# Altium schematic symbol library LATTICEPLDS_Library.SchLib: 291 symbols (part 24 of 32) (continued)
## LFSC15-F900_bak (continued)
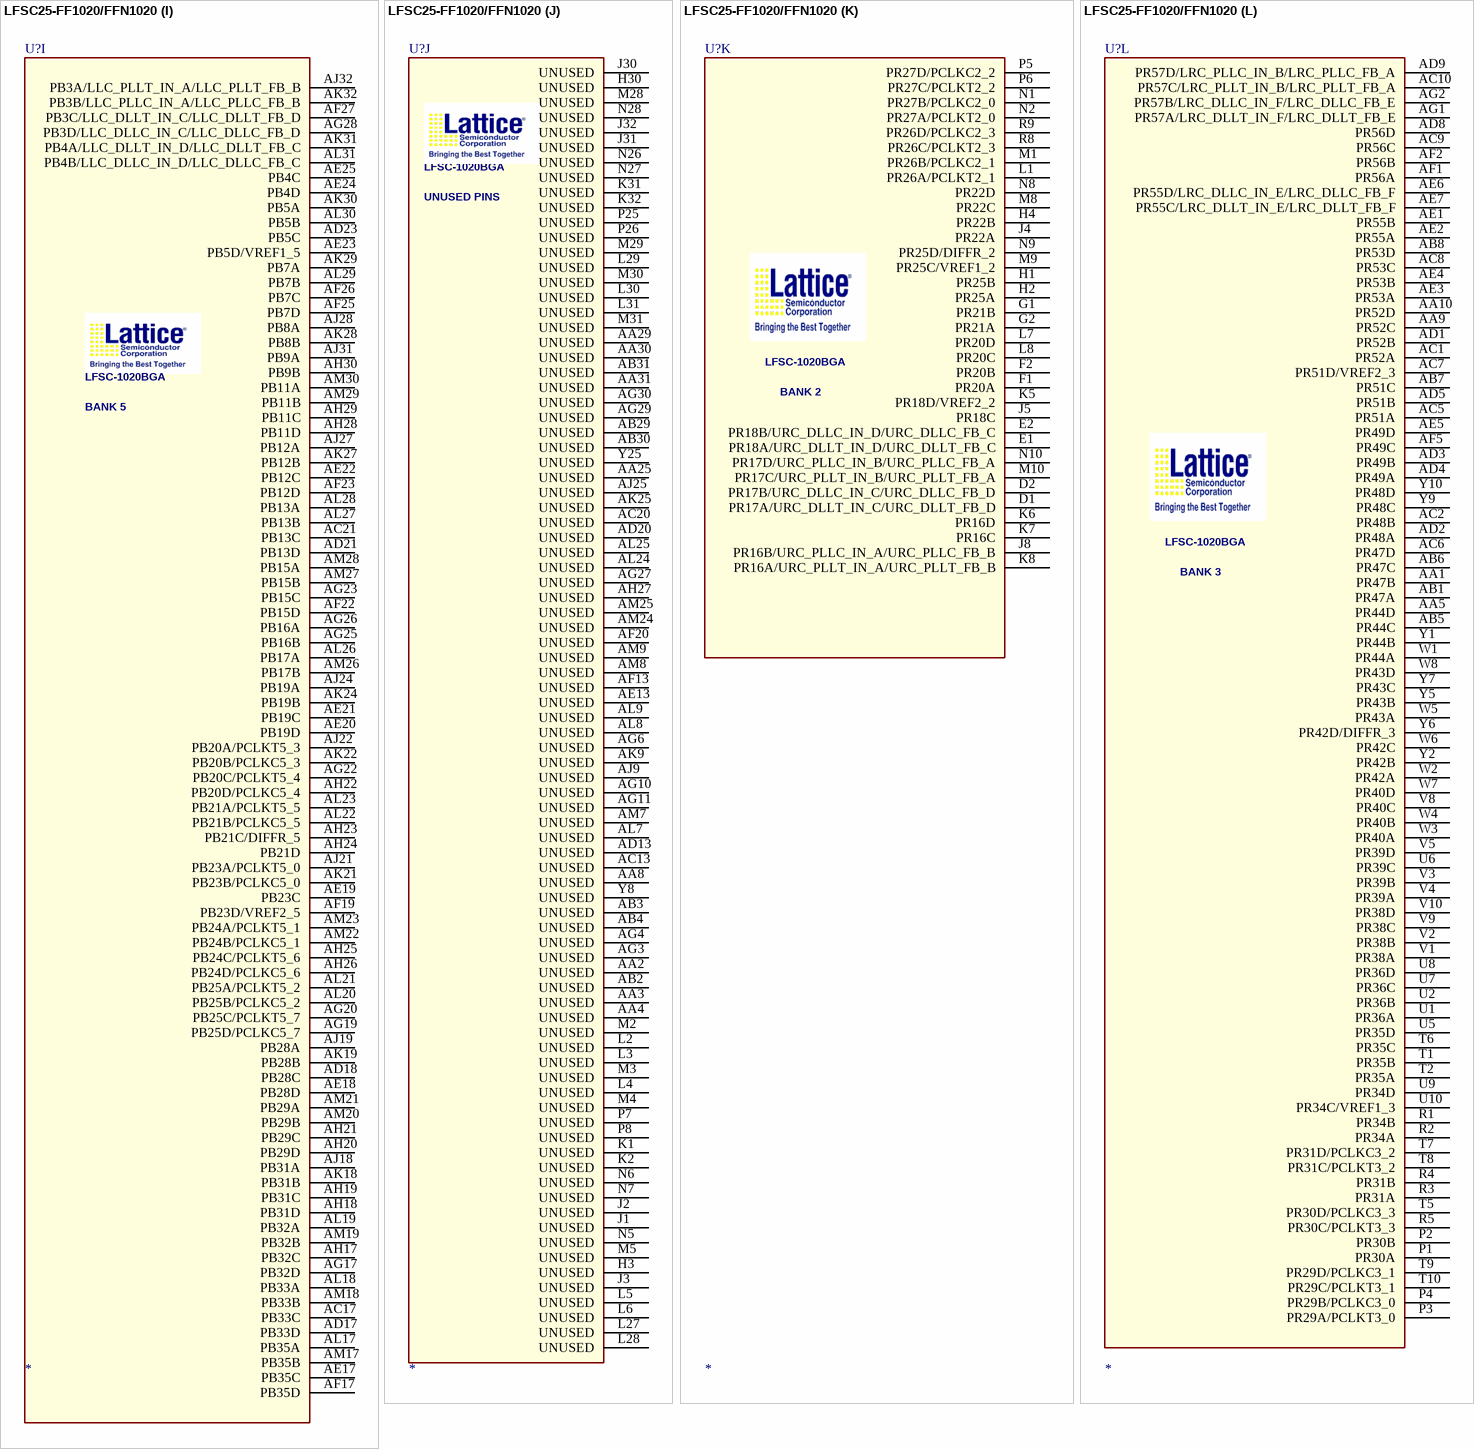
[diagram p235: symbol LFSC25-FF1020/FFN1020]
part A text: SERDES; SC-900FPBGA
part B text: SERDES / SUPPLIES; SC-900FPBGA
part C text: VCCIO; SC-900FPBGA
part D text: SC-900FPBGA
part E text: SC-900FPBGA
part F text: VSS; SC-900FPBGA
part G text: SC-900FPBGA
part H text: SC-900FPBGA
part I text: SC-900FPBGA
part J text: SC-900FPBGA; Memory / Controller
part K text: MPI / DATA/ADDR; SC-900FPBGA
part L text: VCCAUX; SC-900FPBGA
part M text: General Purpose / IO Pins; SC-900FPBGA
part N text: SC-900FPBGA; SPI4
part O text: SFI4/XSBI / RX; SC-900FPBGA
part P text: SFI4/XSBI / TX; SC-900FPBGA

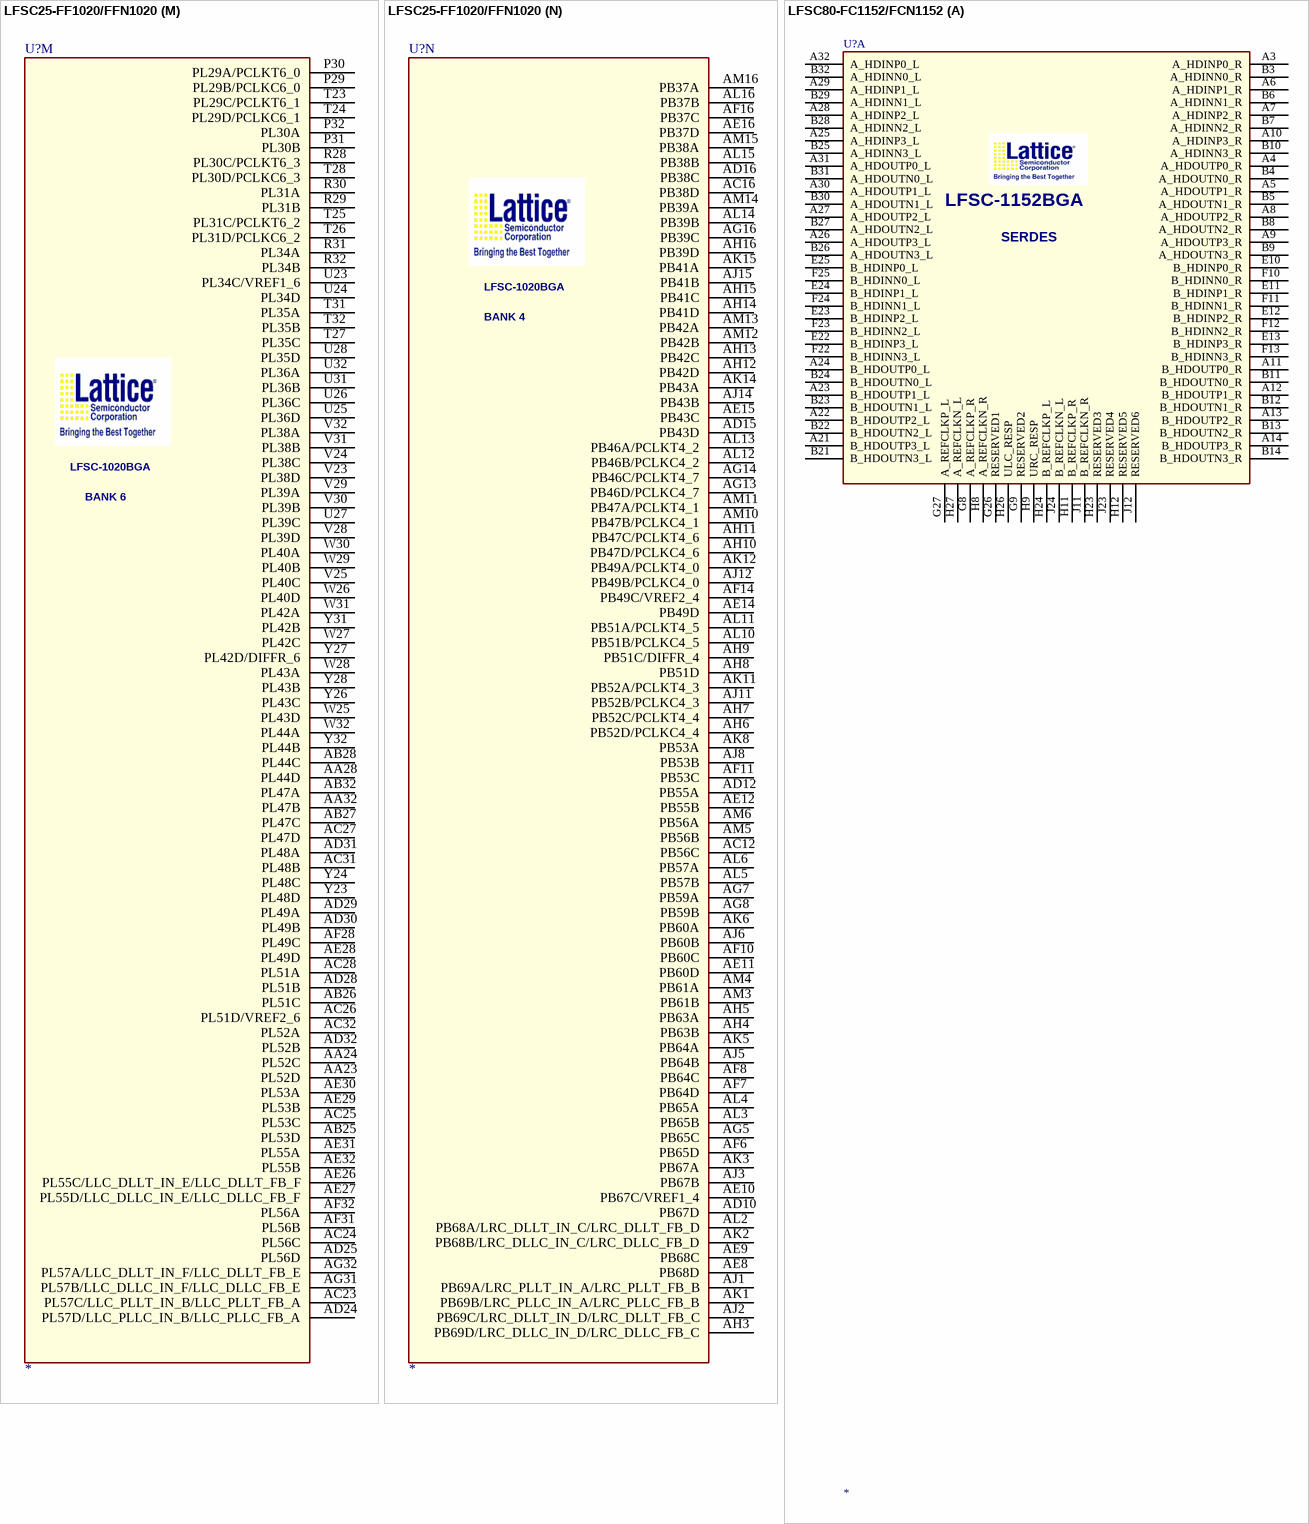
[diagram p236: symbols LFSC25-FF1020/FFN1020 to LFSC80-FC1152/FCN1152]

## LFSC25-FF1020/FFN1020
designator U?
SWAP_INFO: (S1+S2+S3+S4+S5+S6+S7+S8+S9+S10+S11); SPLIT_INST: TRUE
part A pins: AA11 VCCAUX (power), AA12 VCCAUX (power), AA14 VCC12 (power), AA16 VCC12 (power), AA17 VCC12 (power), AA19 VCC12 (power), AA21 VCCAUX (power), AA22 VCCAUX (power), AB11 VCCAUX (power), AB12 VCCAUX (power), AB13 VTT_4 (power), AB14 VTT_4 (power), AB15 VCCAUX (power), AB16 VCCAUX (power), AB17 VCCAUX (power), AB18 VCCAUX (power), AB19 VTT_5 (power), AB20 VTT_5 (power), AB21 VCCAUX (power), AB22 VCCAUX (power), AC15 VTT_4 (power), AC18 VTT_5 (power), AH1 PROBE_VCC, AH2 PROBE_GND, AH31 TEMP, AH32 XRES, J10 VCCJ (power), L11 VCCAUX (power), L12 VCCAUX (power), L14 VCCAUX (power), L15 VCCAUX (power), L18 VCCAUX (power), L19 VCCAUX (power), L21 VCCAUX (power), L22 VCCAUX (power), M11 VCCAUX (power), M12 VCCAUX (power), M14 VCC12 (power), M16 VCC12 (power), M17 VCC12 (power), M19 VCC12 (power), M21 VCCAUX (power), M22 VCCAUX (power), N11 VTT_2 (power), N22 VTT_7 (power), P11 VCCAUX (power), P12 VCC12 (power), P21 VCC12 (power), P22 VCCAUX (power), R10 VTT_2 (power), R11 VCCAUX (power), R22 VCCAUX (power), R23 VTT_7 (power), T11 VTT_3 (power), T12 VCC12 (power), T21 VCC12 (power), T22 VTT_6 (power), U11 VTT_3 (power), U12 VCC12 (power), U21 VCC12 (power), U22 VTT_6 (power), V11 VCCAUX (power), V22 VCCAUX (power), W11 VCCAUX (power), W12 VCC12 (power), W21 VCC12 (power), W22 VCCAUX (power), Y11 VTT_3 (power), Y22 VTT_6 (power)
part B pins: AA7 VCCIO3 (power), AA27 VCCIO6 (power), AB9 VCCIO3 (power), AB23 VCCIO6 (power), AC4 VCCIO3 (power), AC11 VCCIO4 (power), AC19 VCCIO5 (power), AC30 VCCIO6 (power), AD6 VCCIO3 (power), AD14 VCCIO4 (power), AD22 VCCIO5 (power), AD26 VCCIO6 (power), AF3 VCCIO3 (power), AF9 VCCIO4 (power), AF15 VCCIO4 (power), AF21 VCCIO5 (power), AF29 VCCIO6 (power), AG12 VCCIO4 (power), AG18 VCCIO5 (power), AG24 VCCIO5 (power), AJ7 VCCIO4 (power), AJ13 VCCIO4 (power), AJ17 VCCIO5 (power), AJ23 VCCIO5 (power), AJ30 VCCIO5 (power), AK4 VCCIO4 (power), AK10 VCCIO4 (power), AK16 VCCIO4 (power), AK20 VCCIO5 (power), AK26 VCCIO5 (power), C17 VCCIO1 (power), D16 VCCIO1 (power), F15 VCCIO1 (power), F24 VCCIO1 (power), G4 VCCIO2 (power), G9 VCCIO1 (power), G18 VCCIO1 (power), G30 VCCIO7 (power), J7 VCCIO2 (power), J11 VCCIO1 (power), J19 VCCIO1 (power), J27 VCCIO7 (power), K3 VCCIO2 (power), K14 VCCIO1 (power), K22 VCCIO1 (power), K29 VCCIO7 (power), L10 VCCIO2 (power), L24 VCCIO7 (power), M6 VCCIO2 (power), M26 VCCIO7 (power), N4 VCCIO2 (power), N30 VCCIO7 (power), P9 VCCIO2 (power), P23 VCCIO7 (power), R7 VCCIO2 (power), R27 VCCIO7 (power), T3 VCCIO3 (power), T29 VCCIO6 (power), U4 VCCIO3 (power), U30 VCCIO6 (power), V6 VCCIO3 (power), V26 VCCIO6 (power), W10 VCCIO3 (power), W24 VCCIO6 (power), Y3 VCCIO3 (power), Y29 VCCIO6 (power)
part C pins: N13 VCC (power), N15 VCC (power), N16 VCC (power), N17 VCC (power), N18 VCC (power), N20 VCC (power), P14 VCC (power), P16 VCC (power), P17 VCC (power), P19 VCC (power), R13 VCC (power), R15 VCC (power), R18 VCC (power), R20 VCC (power), T13 VCC (power), T14 VCC (power), T16 VCC (power), T17 VCC (power), T19 VCC (power), T20 VCC (power), U13 VCC (power), U14 VCC (power), U16 VCC (power), U17 VCC (power), U19 VCC (power), U20 VCC (power), V13 VCC (power), V15 VCC (power), V18 VCC (power), V20 VCC (power), W14 VCC (power), W16 VCC (power), W17 VCC (power), W19 VCC (power), Y13 VCC (power), Y15 VCC (power), Y16 VCC (power), Y17 VCC (power), Y18 VCC (power), Y20 VCC (power)
part D pins: A2 GND (power), A10 GND (power), A23 GND (power), A31 GND (power), AA6 GND (power), AA13 GND (power), AA15 GND (power), AA18 GND (power), AA20 GND (power), AA26 GND (power), AB10 GND (power), AB24 GND (power), AC3 GND (power), AC14 GND (power), AC22 GND (power), AC29 GND (power), AD7 GND (power), AD11 GND (power), AD19 GND (power), AD27 GND (power), AF4 GND (power), AF12 GND (power), AF18 GND (power), AF24 GND (power), AF30 GND (power), AG9 GND (power), AG15 GND (power), AG21 GND (power), AJ4 GND (power), AJ10 GND (power), AJ16 GND (power), AJ20 GND (power), AJ26 GND (power), AJ29 GND (power), AK7 GND (power), AK13 GND (power), AK17 GND (power), AK23 GND (power), AL1 GND (power), AL32 GND (power), AM2 GND (power), AM31 GND (power), B1 GND (power), B32 GND (power), C3 GND (power), C4 GND (power), C6 GND (power), C7 GND (power), C8 GND (power), C9 GND (power), C11 GND (power), C12 GND (power), C16 GND (power), C21 GND (power), C22 GND (power), C24 GND (power), C25 GND (power), C26 GND (power), C27 GND (power), C29 GND (power), C30 GND (power), D17 GND (power), F3 GND (power), F9 GND (power), F18 GND (power), F30 GND (power), G3 GND (power), G15 GND (power), G24 GND (power), G29 GND (power), J6 GND (power), J14 GND (power), J22 GND (power), J26 GND (power), K4 GND (power), K11 GND (power), K19 GND (power), K30 GND (power), L9 GND (power), L23 GND (power), M7 GND (power), M13 GND (power), M15 GND (power), M18 GND (power), M20 GND (power), M27 GND (power), N3 GND (power), N12 GND (power), N14 GND (power), N19 GND (power), N21 GND (power), N29 GND (power), P10 GND (power), P13 GND (power), P15 GND (power), P18 GND (power), P20 GND (power), P24 GND (power), R6 GND (power), R12 GND (power), R14 GND (power), R16 GND (power), R17 GND (power), R19 GND (power), R21 GND (power), R26 GND (power), T4 GND (power), T15 GND (power), T18 GND (power), T30 GND (power), U3 GND (power), U15 GND (power), U18 GND (power), U29 GND (power), V7 GND (power), V12 GND (power), V14 GND (power), V16 GND (power), V17 GND (power), V19 GND (power), V21 GND (power), V27 GND (power), W9 GND (power), W13 GND (power), W15 GND (power), W18 GND (power), W20 GND (power), W23 GND (power), Y4 GND (power), Y12 GND (power), Y14 GND (power), Y19 GND (power), Y21 GND (power), Y30 GND (power)
part E pins: A5 VDDAX25_R, A28 VDDAX25_L, B2 A_VDDIB0_R, B5 A_VDDP_R, B10 B_VDDP_R, B23 B_VDDP_L, B28 A_VDDP_L, B31 A_VDDIB0_L, D3 A_VDDOB0_R, D4 A_VDDOB1_R, D6 A_VDDOB2_R, D7 A_VDDOB3_R, D8 B_VDDOB0_R, D9 B_VDDOB1_R, D11 B_VDDOB2_R, D12 B_VDDOB3_R, D21 B_VDDOB3_L, D22 B_VDDOB2_L, D24 B_VDDOB1_L, D25 B_VDDOB0_L, D26 A_VDDOB3_L, D27 A_VDDOB2_L, D29 A_VDDOB1_L, D30 A_VDDOB0_L, E3 A_VDDRX01_R, E4 A_VDDTX01_R, E6 A_VDDRX23_R, E7 A_VDDTX23_R, E8 B_VDDRX01_R, E9 B_VDDTX01_R, E11 B_VDDRX23_R, E12 B_VDDTX23_R, E21 B_VDDTX23_L, E22 B_VDDRX23_L, E24 B_VDDTX01_L, E25 B_VDDRX01_L, E26 A_VDDTX23_L, E27 A_VDDRX23_L, E29 A_VDDTX01_L, E30 A_VDDRX01_L, F4 A_VDDIB1_R, F29 A_VDDIB1_L, H6 A_VDDIB2_R, H7 A_VDDIB3_R, H8 B_VDDIB0_R, H9 B_VDDIB1_R, H11 B_VDDIB2_R, H12 B_VDDIB3_R, H21 B_VDDIB3_L, H22 B_VDDIB2_L, H24 B_VDDIB1_L, H25 B_VDDIB0_L, H26 A_VDDIB3_L, H27 A_VDDIB2_L
part F pins: A3 A_HDOUTP0_R, A4 A_HDOUTP1_R, A6 A_HDOUTP2_R, A7 A_HDOUTP3_R, A8 B_HDOUTP0_R, A9 B_HDOUTP1_R, A11 B_HDOUTP2_R, A12 B_HDOUTP3_R, A21 B_HDOUTP3_L, A22 B_HDOUTP2_L, A24 B_HDOUTP1_L, A25 B_HDOUTP0_L, A26 A_HDOUTP3_L, A27 A_HDOUTP2_L, A29 A_HDOUTP1_L, A30 A_HDOUTP0_L, B3 A_HDOUTN0_R, B4 A_HDOUTN1_R, B6 A_HDOUTN2_R, B7 A_HDOUTN3_R, B8 B_HDOUTN0_R, B9 B_HDOUTN1_R, B11 B_HDOUTN2_R, B12 B_HDOUTN3_R, B21 B_HDOUTN3_L, B22 B_HDOUTN2_L, B24 B_HDOUTN1_L, B25 B_HDOUTN0_L, B26 A_HDOUTN3_L, B27 A_HDOUTN2_L, B29 A_HDOUTN1_L, B30 A_HDOUTN0_L, C1 A_HDINP0_R, C2 A_HDINN0_R, C5 A_REFCLKP_R, C10 B_REFCLKP_R, C23 B_REFCLKP_L, C28 A_REFCLKP_L, C31 A_HDINN0_L, C32 A_HDINP0_L, D5 A_REFCLKN_R, D10 B_REFCLKN_R, D23 B_REFCLKN_L, D28 A_REFCLKN_L, E5 A_RXREFCLKP_R, E10 B_RXREFCLKP_R, E23 B_RXREFCLKP_L, E28 A_RXREFCLKP_L, F5 A_RXREFCLKN_R, F6 A_HDINP2_R, F7 A_HDINP3_R, F8 B_HDINP0_R, F10 B_RXREFCLKN_R, F11 B_HDINP2_R, F12 B_HDINP3_R, F21 B_HDINP3_L, F22 B_HDINP2_L, F23 B_RXREFCLKN_L, F25 B_HDINP0_L, F26 A_HDINP3_L, F27 A_HDINP2_L, F28 A_RXREFCLKN_L, G5 A_HDINP1_R, G6 A_HDINN2_R, G7 A_HDINN3_R, G8 B_HDINN0_R, G10 B_HDINP1_R, G11 B_HDINN2_R, G12 B_HDINN3_R, G21 B_HDINN3_L, G22 B_HDINN2_L, G23 B_HDINP1_L, G25 B_HDINN0_L, G26 A_HDINN3_L, G27 A_HDINN2_L, G28 A_HDINP1_L, H5 A_HDINN1_R, H10 B_HDINN1_R, H23 B_HDINN1_L, H28 A_HDINN1_L
part G pins: A13 PT39A/EXTCLKP2I, A14 PT39B/EXTCLKP2O, A15 PT37A/MPICLK/PCLKT1_0, A16 PT37B/PCLKC1_0, A17 PT35B/MPIRTRYN, A18 PT35A/A0, A19 PT32B/A5, A20 PT32A/A6, B13 PT43A/QOUT, B14 PT43B/D0, B15 PT38A/MPIACKN, B16 PT38B/DP0, B17 PT33B/A3, B18 PT33A/A4, B19 PT28B/A11, B20 PT28A/A12, C13 PT45B/D2, C14 PT45A/D1, C15 PT42B/DOUT, C18 PT29B/A9, C19 PT27A/A14, C20 PT27B/A13, D13 PT46B/D6, D14 PT46A/D5, D15 PT42A/EXTDONEI, D18 PT29A/A10, D19 PT25A/A17, D20 PT25B/A15, E13 PT49B/D8, E14 PT47B/CS0N, E15 PT45D/D4, E16 PT45C/D3, E17 PT27D/D11, E18 PT27C/D12, E19 PT24B/A18, E20 PT23B/A21, F13 PT49A/CS1, F14 PT47A/RDN, F16 PT38C/RDY, F17 PT33D/A1, F19 PT24A/MPITEAN, F20 PT23A/D15, G13 PT47C/D10, G14 PT46C/D7, G16 PT38D/EXTDONEO, G17 PT33C/A2, G19 PT25C/D13, G20 PT24C/A20, H13 PT47D/D9, H14 PT46D/WRN, H15 PT39D/D21/PCLKC1_1, H16 PT39C/D22/PCLKT1_1, H17 PT32D/D25/PCLKC1_5, H18 PT32C/D26/PCLKT1_5, H19 PT25D/A16, H20 PT24D/A19, J9 TDO, J12 TCK, J13 TDI, J15 PT49D/HDC, J16 PT41B/EXTCLKP1O, J17 PT31B/A7, J18 PT23D/D14, J20 RDCFGN, J21 RESETN, J23 M1, J24 M2, K9 TMS, K10 CCLK, K12 PROGRAMN, K13 MPIIRQN, K15 PT49C/LDCN, K16 PT41A/EXTCLKP1I, K17 PT31A/A8, K18 PT23C/DP1, K20 DONE, K21 INITN, K23 M0, K24 M3, L13 PT42D/VREF2_1, L16 PT37C/DP2, L17 PT35C/D24/PCLKT1_4, L20 PT31C/VREF1_1
part H pins: D31 PL17B/ULC_DLLC_IN_C/ULC_DLLC_FB_D/DEBUG_BUS8, D32 PL17A/ULC_DLLT_IN_C/ULC_DLLT_FB_D/DEBUG_BUS9, E31 PL18B/ULC_DLLC_IN_D/ULC_DLLC_FB_C, E32 PL18A/ULC_DLLT_IN_D/ULC_DLLT_FB_C, F31 PL20B, F32 PL20A, G31 PL21A, G32 PL21B, H29 PL22B, H31 PL25A/TESTCFGN, H32 PL25B/DEBUG_BUS7, J25 PL16B/ULC_PLLC_IN_A/ULC_PLLC_FB_B/DEBUG_BUS10, J28 PL18C/DEBUG_BUS12, J29 PL22A, K25 PL16A/ULC_PLLT_IN_A/ULC_PLLT_FB_B/DEBUG_BUS11, K26 PL16C/DEBUG_BUS13, K27 PL16D, K28 PL18D/VREF2_7/DEBUG_BUS6, L25 PL20C, L26 PL20D, L32 PL26A/PCLKT7_1/DEBUG_BUS3, M23 PL17C/ULC_PLLT_IN_B/ULC_PLLT_FB_A, M24 PL25C/VREF1_7/DEBUG_BUS5, M25 PL22C, M32 PL26B/PCLKC7_1/DEBUG_BUS2, N23 PL17D/ULC_PLLC_IN_B/ULC_PLLC_FB_A, N24 PL25D/DIFFR_7/DEBUG_BUS4, N25 PL22D, N31 PL27A/PCLKT7_0/DEBUG_BUS1, N32 PL27B/PCLKC7_0/DEBUG_BUS0, P27 PL27C/PCLKT7_2/DEBUG_BUS14, P28 PL27D/PCLKC7_2/DEBUG_BUS15, R24 PL26D/PCLKC7_3, R25 PL26C/PCLKT7_3
part I pins: AC17 PB33C, AC21 PB13C, AD17 PB33D, AD18 PB28C, AD21 PB13D, AD23 PB5C, AE17 PB35C, AE18 PB28D, AE19 PB23C, AE20 PB19D, AE21 PB19C, AE22 PB12C, AE23 PB5D/VREF1_5, AE24 PB4D, AE25 PB4C, AF17 PB35D, AF19 PB23D/VREF2_5, AF22 PB15D, AF23 PB12D, AF25 PB7D, AF26 PB7C, AF27 PB3C/LLC_DLLT_IN_C/LLC_DLLT_FB_D, AG17 PB32D, AG19 PB25D/PCLKC5_7, AG20 PB25C/PCLKT5_7, AG22 PB20C/PCLKT5_4, AG23 PB15C, AG25 PB16B, AG26 PB16A, AG28 PB3D/LLC_DLLC_IN_C/LLC_DLLC_FB_D, AH17 PB32C, AH18 PB31D, AH19 PB31C, AH20 PB29D, AH21 PB29C, AH22 PB20D/PCLKC5_4, AH23 PB21C/DIFFR_5, AH24 PB21D, AH25 PB24C/PCLKT5_6, AH26 PB24D/PCLKC5_6, AH28 PB11D, AH29 PB11C, AH30 PB9B, AJ18 PB31A, AJ19 PB28A, AJ21 PB23A/PCLKT5_0, AJ22 PB20A/PCLKT5_3, AJ24 PB19A, AJ27 PB12A, AJ28 PB8A, AJ31 PB9A, AJ32 PB3A/LLC_PLLT_IN_A/LLC_PLLT_FB_B, AK18 PB31B, AK19 PB28B, AK21 PB23B/PCLKC5_0, AK22 PB20B/PCLKC5_3, AK24 PB19B, AK27 PB12B, AK28 PB8B, AK29 PB7A, AK30 PB5A, AK31 PB4A/LLC_DLLT_IN_D/LLC_DLLT_FB_C, AK32 PB3B/LLC_PLLC_IN_A/LLC_PLLC_FB_B, AL17 PB35A, AL18 PB33A, AL19 PB32A, AL20 PB25B/PCLKC5_2, AL21 PB25A/PCLKT5_2, AL22 PB21B/PCLKC5_5, AL23 PB21A/PCLKT5_5, AL26 PB17A, AL27 PB13B, AL28 PB13A, AL29 PB7B, AL30 PB5B, AL31 PB4B/LLC_DLLC_IN_D/LLC_DLLC_FB_C, AM17 PB35B, AM18 PB33B, AM19 PB32B, AM20 PB29B, AM21 PB29A, AM22 PB24B/PCLKC5_1, AM23 PB24A/PCLKT5_1, AM26 PB17B, AM27 PB15B, AM28 PB15A, AM29 PB11B, AM30 PB11A
part J pins: AA2 UNUSED, AA3 UNUSED, AA4 UNUSED, AA8 UNUSED, AA25 UNUSED, AA29 UNUSED, AA30 UNUSED, AA31 UNUSED, AB2 UNUSED, AB3 UNUSED, AB4 UNUSED, AB29 UNUSED, AB30 UNUSED, AB31 UNUSED, AC13 UNUSED, AC20 UNUSED, AD13 UNUSED, AD20 UNUSED, AE13 UNUSED, AF13 UNUSED, AF20 UNUSED, AG3 UNUSED, AG4 UNUSED, AG6 UNUSED, AG10 UNUSED, AG11 UNUSED, AG27 UNUSED, AG29 UNUSED, AG30 UNUSED, AH27 UNUSED, AJ9 UNUSED, AJ25 UNUSED, AK9 UNUSED, AK25 UNUSED, AL7 UNUSED, AL8 UNUSED, AL9 UNUSED, AL24 UNUSED, AL25 UNUSED, AM7 UNUSED, AM8 UNUSED, AM9 UNUSED, AM24 UNUSED, AM25 UNUSED, H3 UNUSED, H30 UNUSED, J1 UNUSED, J2 UNUSED, J3 UNUSED, J30 UNUSED, J31 UNUSED, J32 UNUSED, K1 UNUSED, K2 UNUSED, K31 UNUSED, K32 UNUSED, L2 UNUSED, L3 UNUSED, L4 UNUSED, L5 UNUSED, L6 UNUSED, L27 UNUSED, L28 UNUSED, L29 UNUSED, L30 UNUSED, L31 UNUSED, M2 UNUSED, M3 UNUSED, M4 UNUSED, M5 UNUSED, M28 UNUSED, M29 UNUSED, M30 UNUSED, M31 UNUSED, N5 UNUSED, N6 UNUSED, N7 UNUSED, N26 UNUSED, N27 UNUSED, N28 UNUSED, P7 UNUSED, P8 UNUSED, P25 UNUSED, P26 UNUSED, Y8 UNUSED, Y25 UNUSED
part K pins: D1 PR17A/URC_DLLT_IN_C/URC_DLLT_FB_D, D2 PR17B/URC_DLLC_IN_C/URC_DLLC_FB_D, E1 PR18A/URC_DLLT_IN_D/URC_DLLT_FB_C, E2 PR18B/URC_DLLC_IN_D/URC_DLLC_FB_C, F1 PR20A, F2 PR20B, G1 PR21B, G2 PR21A, H1 PR25B, H2 PR25A, H4 PR22B, J4 PR22A, J5 PR18C, J8 PR16B/URC_PLLC_IN_A/URC_PLLC_FB_B, K5 PR18D/VREF2_2, K6 PR16D, K7 PR16C, K8 PR16A/URC_PLLT_IN_A/URC_PLLT_FB_B, L1 PR26A/PCLKT2_1, L7 PR20D, L8 PR20C, M1 PR26B/PCLKC2_1, M8 PR22C, M9 PR25C/VREF1_2, M10 PR17C/URC_PLLT_IN_B/URC_PLLT_FB_A, N1 PR27B/PCLKC2_0, N2 PR27A/PCLKT2_0, N8 PR22D, N9 PR25D/DIFFR_2, N10 PR17D/URC_PLLC_IN_B/URC_PLLC_FB_A, P5 PR27D/PCLKC2_2, P6 PR27C/PCLKT2_2, R8 PR26C/PCLKT2_3, R9 PR26D/PCLKC2_3
part L pins: AA1 PR47B, AA5 PR44D, AA9 PR52C, AA10 PR52D, AB1 PR47A, AB5 PR44C, AB6 PR47C, AB7 PR51C, AB8 PR53D, AC1 PR52A, AC2 PR48B, AC5 PR51A, AC6 PR47D, AC7 PR51D/VREF2_3, AC8 PR53C, AC9 PR56C, AC10 PR57C/LRC_PLLT_IN_B/LRC_PLLT_FB_A, AD1 PR52B, AD2 PR48A, AD3 PR49B, AD4 PR49A, AD5 PR51B, AD8 PR56D, AD9 PR57D/LRC_PLLC_IN_B/LRC_PLLC_FB_A, AE1 PR55B, AE2 PR55A, AE3 PR53A, AE4 PR53B, AE5 PR49D, AE6 PR55D/LRC_DLLC_IN_E/LRC_DLLC_FB_F, AE7 PR55C/LRC_DLLT_IN_E/LRC_DLLT_FB_F, AF1 PR56A, AF2 PR56B, AF5 PR49C, AG1 PR57A/LRC_DLLT_IN_F/LRC_DLLT_FB_E, AG2 PR57B/LRC_DLLC_IN_F/LRC_DLLC_FB_E, P1 PR30A, P2 PR30B, P3 PR29A/PCLKT3_0, P4 PR29B/PCLKC3_0, R1 PR34B, R2 PR34A, R3 PR31A, R4 PR31B, R5 PR30C/PCLKT3_3, T1 PR35B, T2 PR35A, T5 PR30D/PCLKC3_3, T6 PR35C, T7 PR31D/PCLKC3_2, T8 PR31C/PCLKT3_2, T9 PR29D/PCLKC3_1, T10 PR29C/PCLKT3_1, U1 PR36A, U2 PR36B, U5 PR35D, U6 PR39C, U7 PR36C, U8 PR36D, U9 PR34D, U10 PR34C/VREF1_3, V1 PR38A, V2 PR38B, V3 PR39B, V4 PR39A, V5 PR39D, V8 PR40C, V9 PR38C, V10 PR38D, W1 PR44A, W2 PR42A, W3 PR40A, W4 PR40B, W5 PR43A, W6 PR42C, W7 PR40D, W8 PR43D, Y1 PR44B, Y2 PR42B, Y5 PR43B, Y6 PR42D/DIFFR_3, Y7 PR43C, Y9 PR48C, Y10 PR48D
part M pins: AA23 PL52D, AA24 PL52C, AA28 PL44D, AA32 PL47B, AB25 PL53D, AB26 PL51C, AB27 PL47C, AB28 PL44C, AB32 PL47A, AC23 PL57C/LLC_PLLT_IN_B/LLC_PLLT_FB_A, AC24 PL56C, AC25 PL53C, AC26 PL51D/VREF2_6, AC27 PL47D, AC28 PL51A, AC31 PL48B, AC32 PL52A, AD24 PL57D/LLC_PLLC_IN_B/LLC_PLLC_FB_A, AD25 PL56D, AD28 PL51B, AD29 PL49A, AD30 PL49B, AD31 PL48A, AD32 PL52B, AE26 PL55C/LLC_DLLT_IN_E/LLC_DLLT_FB_F, AE27 PL55D/LLC_DLLC_IN_E/LLC_DLLC_FB_F, AE28 PL49D, AE29 PL53B, AE30 PL53A, AE31 PL55A, AE32 PL55B, AF28 PL49C, AF31 PL56B, AF32 PL56A, AG31 PL57B/LLC_DLLC_IN_F/LLC_DLLC_FB_E, AG32 PL57A/LLC_DLLT_IN_F/LLC_DLLT_FB_E, P29 PL29B/PCLKC6_0, P30 PL29A/PCLKT6_0, P31 PL30B, P32 PL30A, R28 PL30C/PCLKT6_3, R29 PL31B, R30 PL31A, R31 PL34A, R32 PL34B, T23 PL29C/PCLKT6_1, T24 PL29D/PCLKC6_1, T25 PL31C/PCLKT6_2, T26 PL31D/PCLKC6_2, T27 PL35C, T28 PL30D/PCLKC6_3, T31 PL35A, T32 PL35B, U23 PL34C/VREF1_6, U24 PL34D, U25 PL36D, U26 PL36C, U27 PL39C, U28 PL35D, U31 PL36B, U32 PL36A, V23 PL38D, V24 PL38C, V25 PL40C, V28 PL39D, V29 PL39A, V30 PL39B, V31 PL38B, V32 PL38A, W25 PL43D, W26 PL40D, W27 PL42C, W28 PL43A, W29 PL40B, W30 PL40A, W31 PL42A, W32 PL44A, Y23 PL48D, Y24 PL48C, Y26 PL43C, Y27 PL42D/DIFFR_6, Y28 PL43B, Y31 PL42B, Y32 PL44B
part N pins: AC12 PB56C, AC16 PB38D, AD10 PB67D, AD12 PB55A, AD15 PB43D, AD16 PB38C, AE8 PB68D, AE9 PB68C, AE10 PB67C/VREF1_4, AE11 PB60D, AE12 PB55B, AE14 PB49D, AE15 PB43C, AE16 PB37D, AF6 PB65D, AF7 PB64D, AF8 PB64C, AF10 PB60C, AF11 PB53C, AF14 PB49C/VREF2_4, AF16 PB37C, AG5 PB65C, AG7 PB59A, AG8 PB59B, AG13 PB46D/PCLKC4_7, AG14 PB46C/PCLKT4_7, AG16 PB39C, AH3 PB69D/LRC_DLLC_IN_D/LRC_DLLC_FB_C, AH4 PB63B, AH5 PB63A, AH6 PB52D/PCLKC4_4, AH7 PB52C/PCLKT4_4, AH8 PB51D, AH9 PB51C/DIFFR_4, AH10 PB47D/PCLKC4_6, AH11 PB47C/PCLKT4_6, AH12 PB42D, AH13 PB42C, AH14 PB41D, AH15 PB41C, AH16 PB39D, AJ1 PB69A/LRC_PLLT_IN_A/LRC_PLLT_FB_B, AJ2 PB69C/LRC_DLLT_IN_D/LRC_DLLT_FB_C, AJ3 PB67B, AJ5 PB64B, AJ6 PB60B, AJ8 PB53B, AJ11 PB52B/PCLKC4_3, AJ12 PB49B/PCLKC4_0, AJ14 PB43B, AJ15 PB41B, AK1 PB69B/LRC_PLLC_IN_A/LRC_PLLC_FB_B, AK2 PB68B/LRC_DLLC_IN_C/LRC_DLLC_FB_D, AK3 PB67A, AK5 PB64A, AK6 PB60A, AK8 PB53A, AK11 PB52A/PCLKT4_3, AK12 PB49A/PCLKT4_0, AK14 PB43A, AK15 PB41A, AL2 PB68A/LRC_DLLT_IN_C/LRC_DLLT_FB_D, AL3 PB65B, AL4 PB65A, AL5 PB57B, AL6 PB57A, AL10 PB51B/PCLKC4_5, AL11 PB51A/PCLKT4_5, AL12 PB46B/PCLKC4_2, AL13 PB46A/PCLKT4_2, AL14 PB39B, AL15 PB38B, AL16 PB37B, AM3 PB61B, AM4 PB61A, AM5 PB56B, AM6 PB56A, AM10 PB47B/PCLKC4_1, AM11 PB47A/PCLKT4_1, AM12 PB42B, AM13 PB42A, AM14 PB39A, AM15 PB38A, AM16 PB37A
part A text: LFSC-1020BGA; SUPPLIES
part B text: LFSC-1020BGA; SUPPLIES
part C text: LFSC-1020BGA; SUPPLIES
part D text: LFSC-1020BGA; SUPPLIES
part E text: LFSC-1020BGA; ANALOG POWER
part F text: LFSC-1020BGA; SERDES
part G text: LFSC-1020BGA; CONFIG/TOP BANK
part H text: LFSC-1020BGA; BANK 7
part I text: LFSC-1020BGA; BANK 5
part J text: LFSC-1020BGA; UNUSED PINS
part K text: LFSC-1020BGA; BANK 2
part L text: LFSC-1020BGA; BANK 3
part M text: LFSC-1020BGA; BANK 6
part N text: LFSC-1020BGA; BANK 4

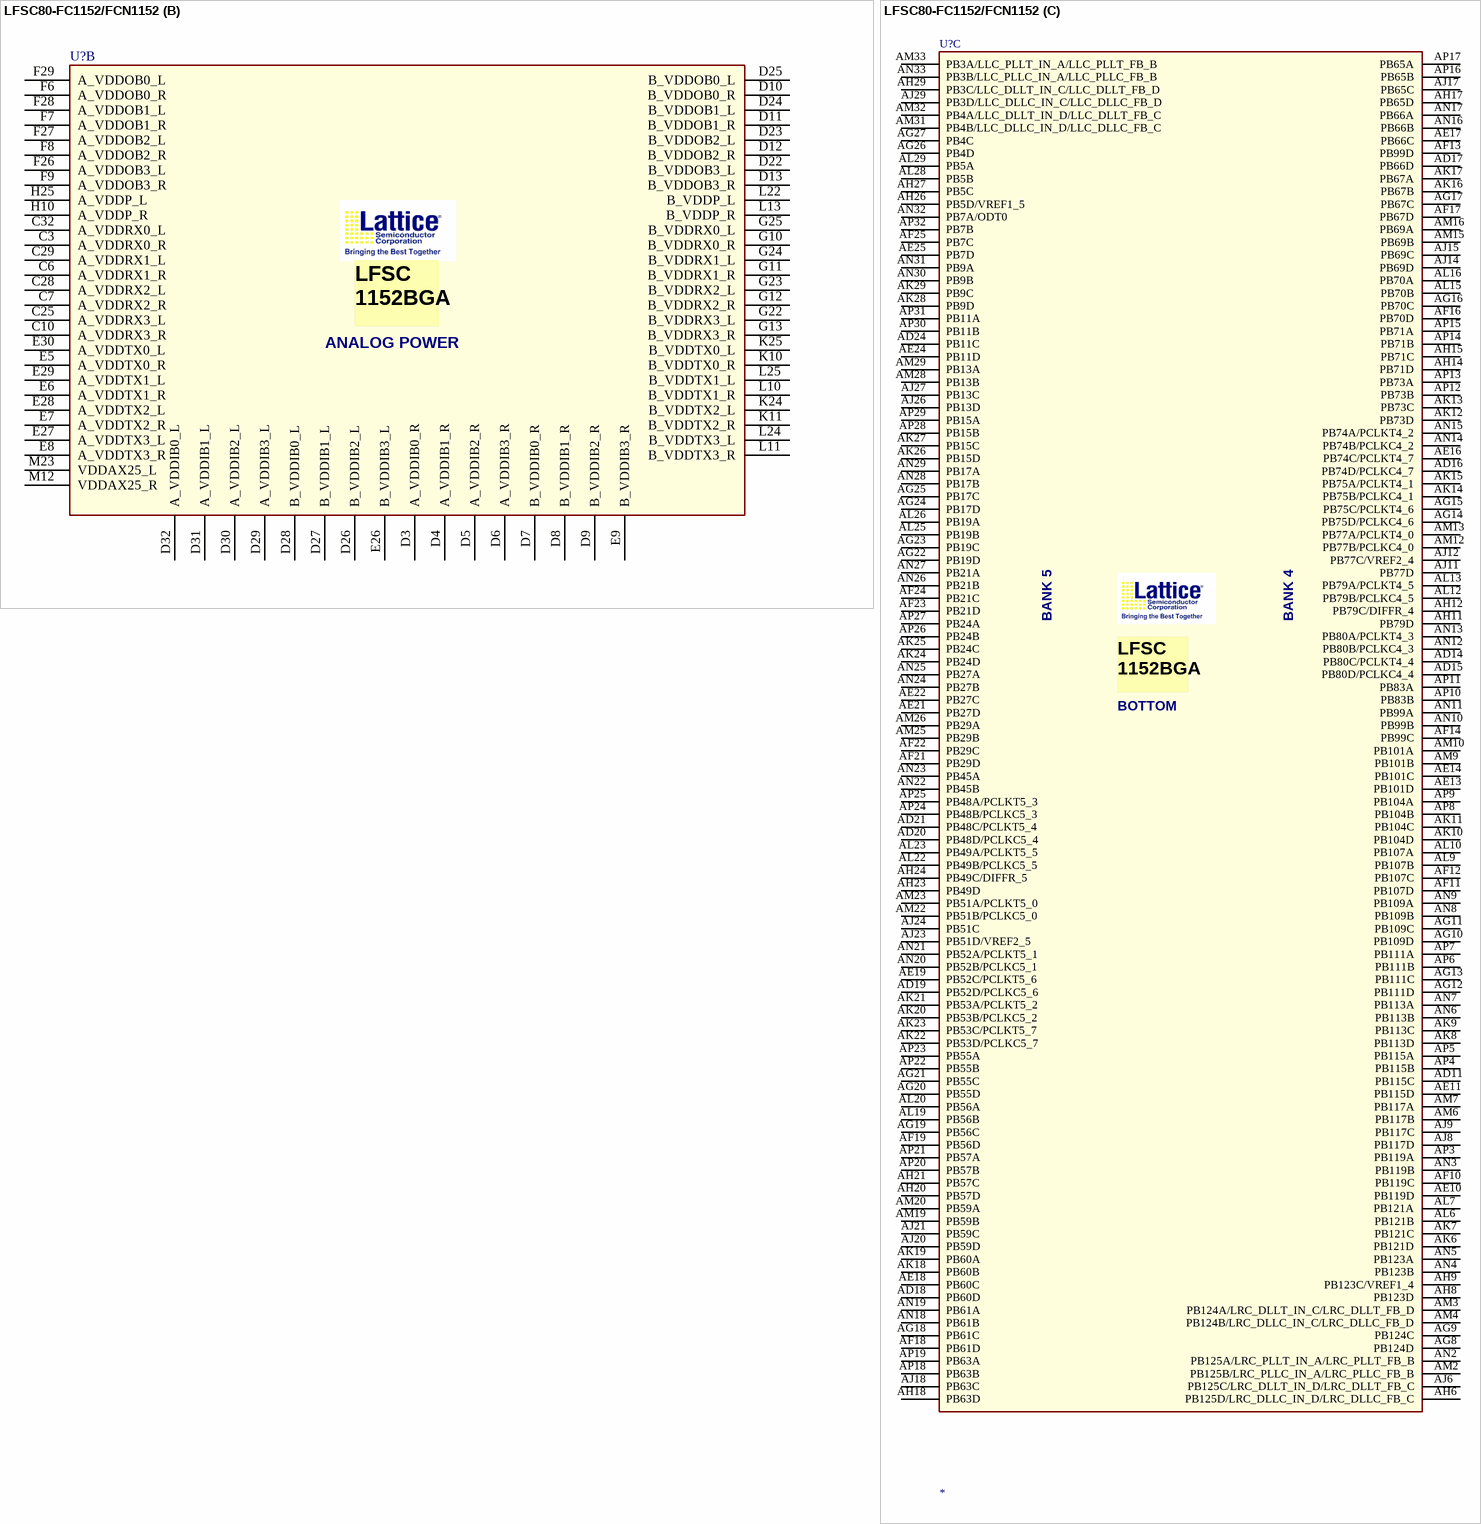
[diagram p237: symbol LFSC80-FC1152/FCN1152]

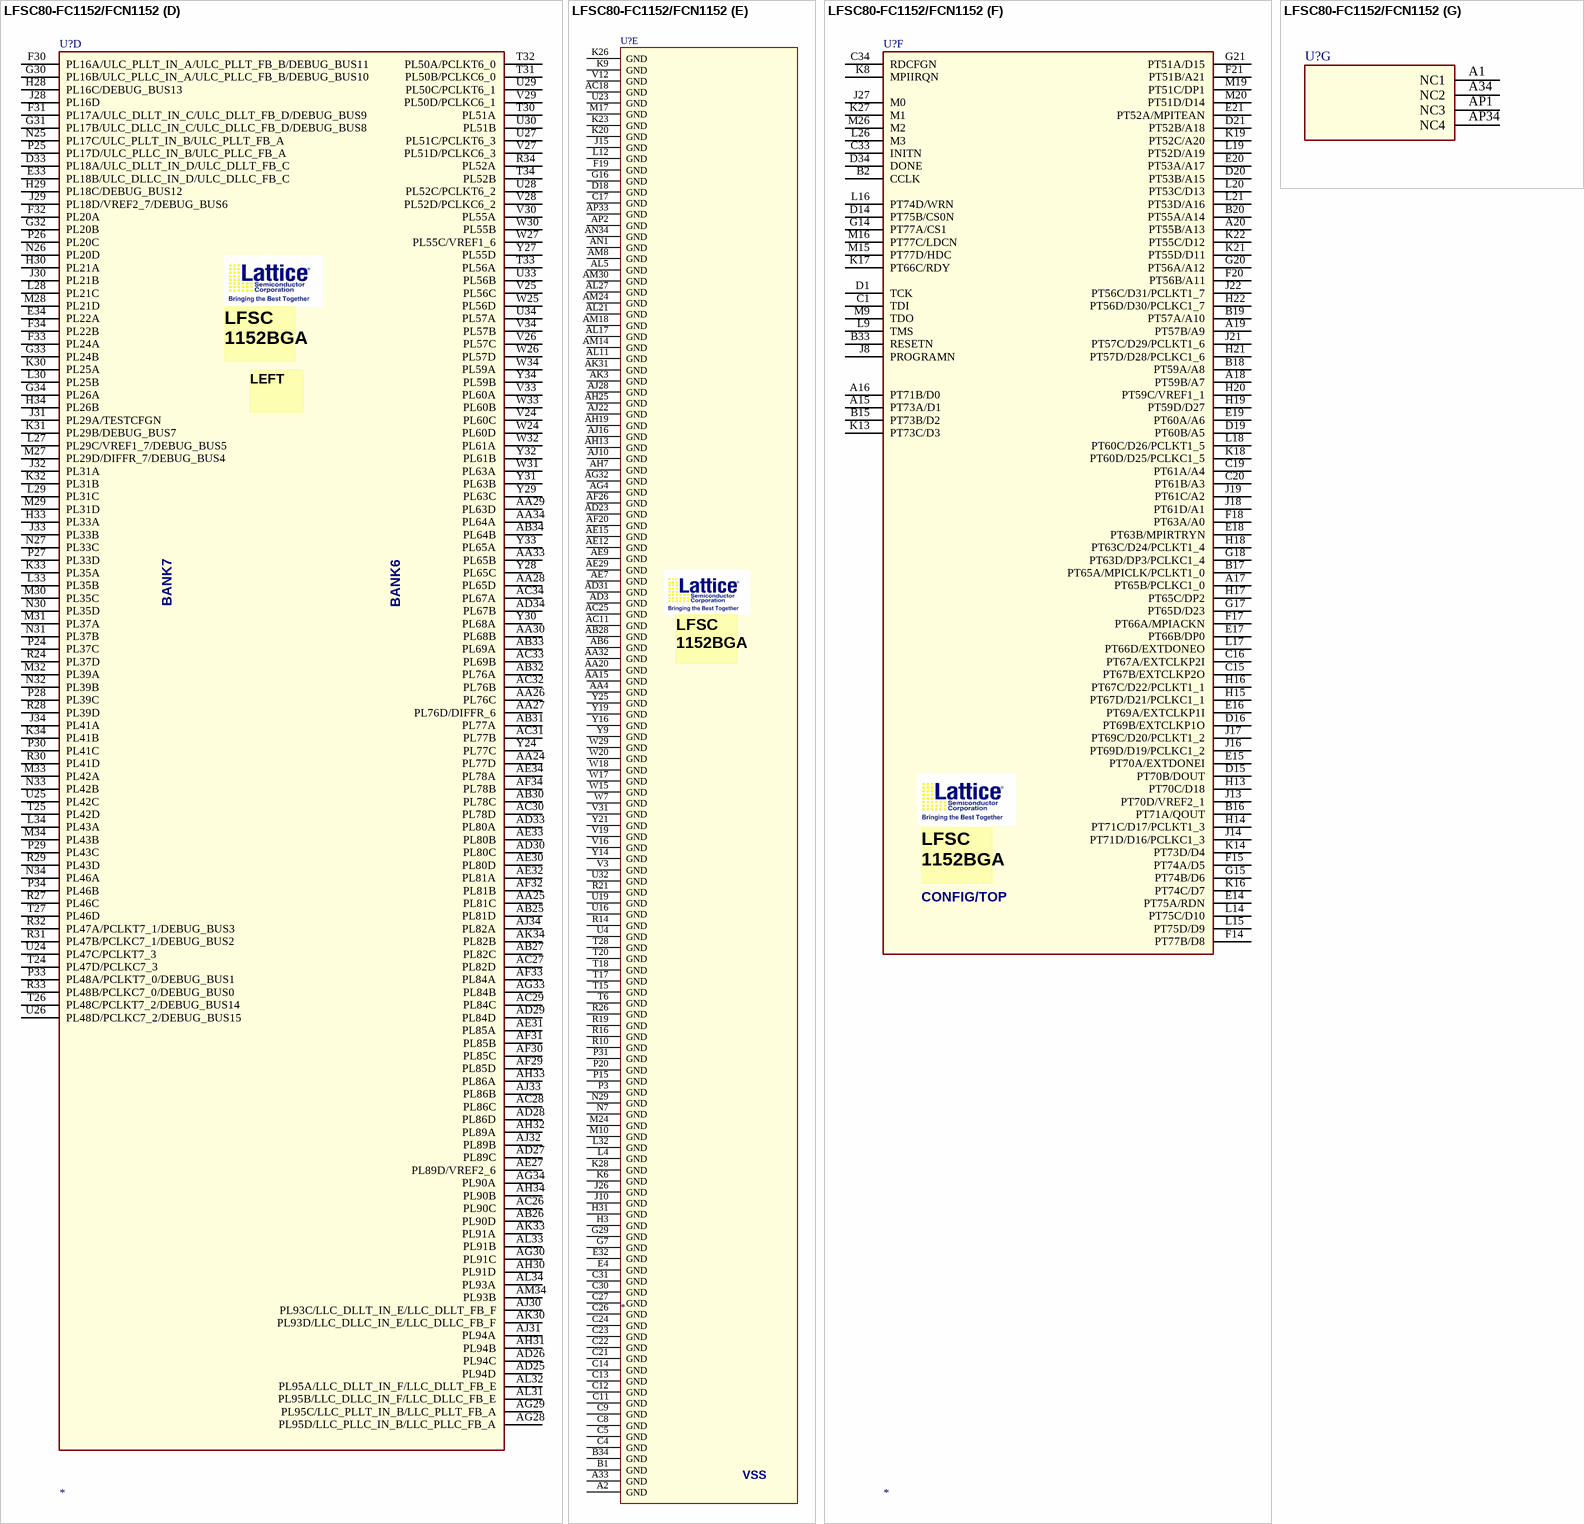
[diagram p238: symbol LFSC80-FC1152/FCN1152]

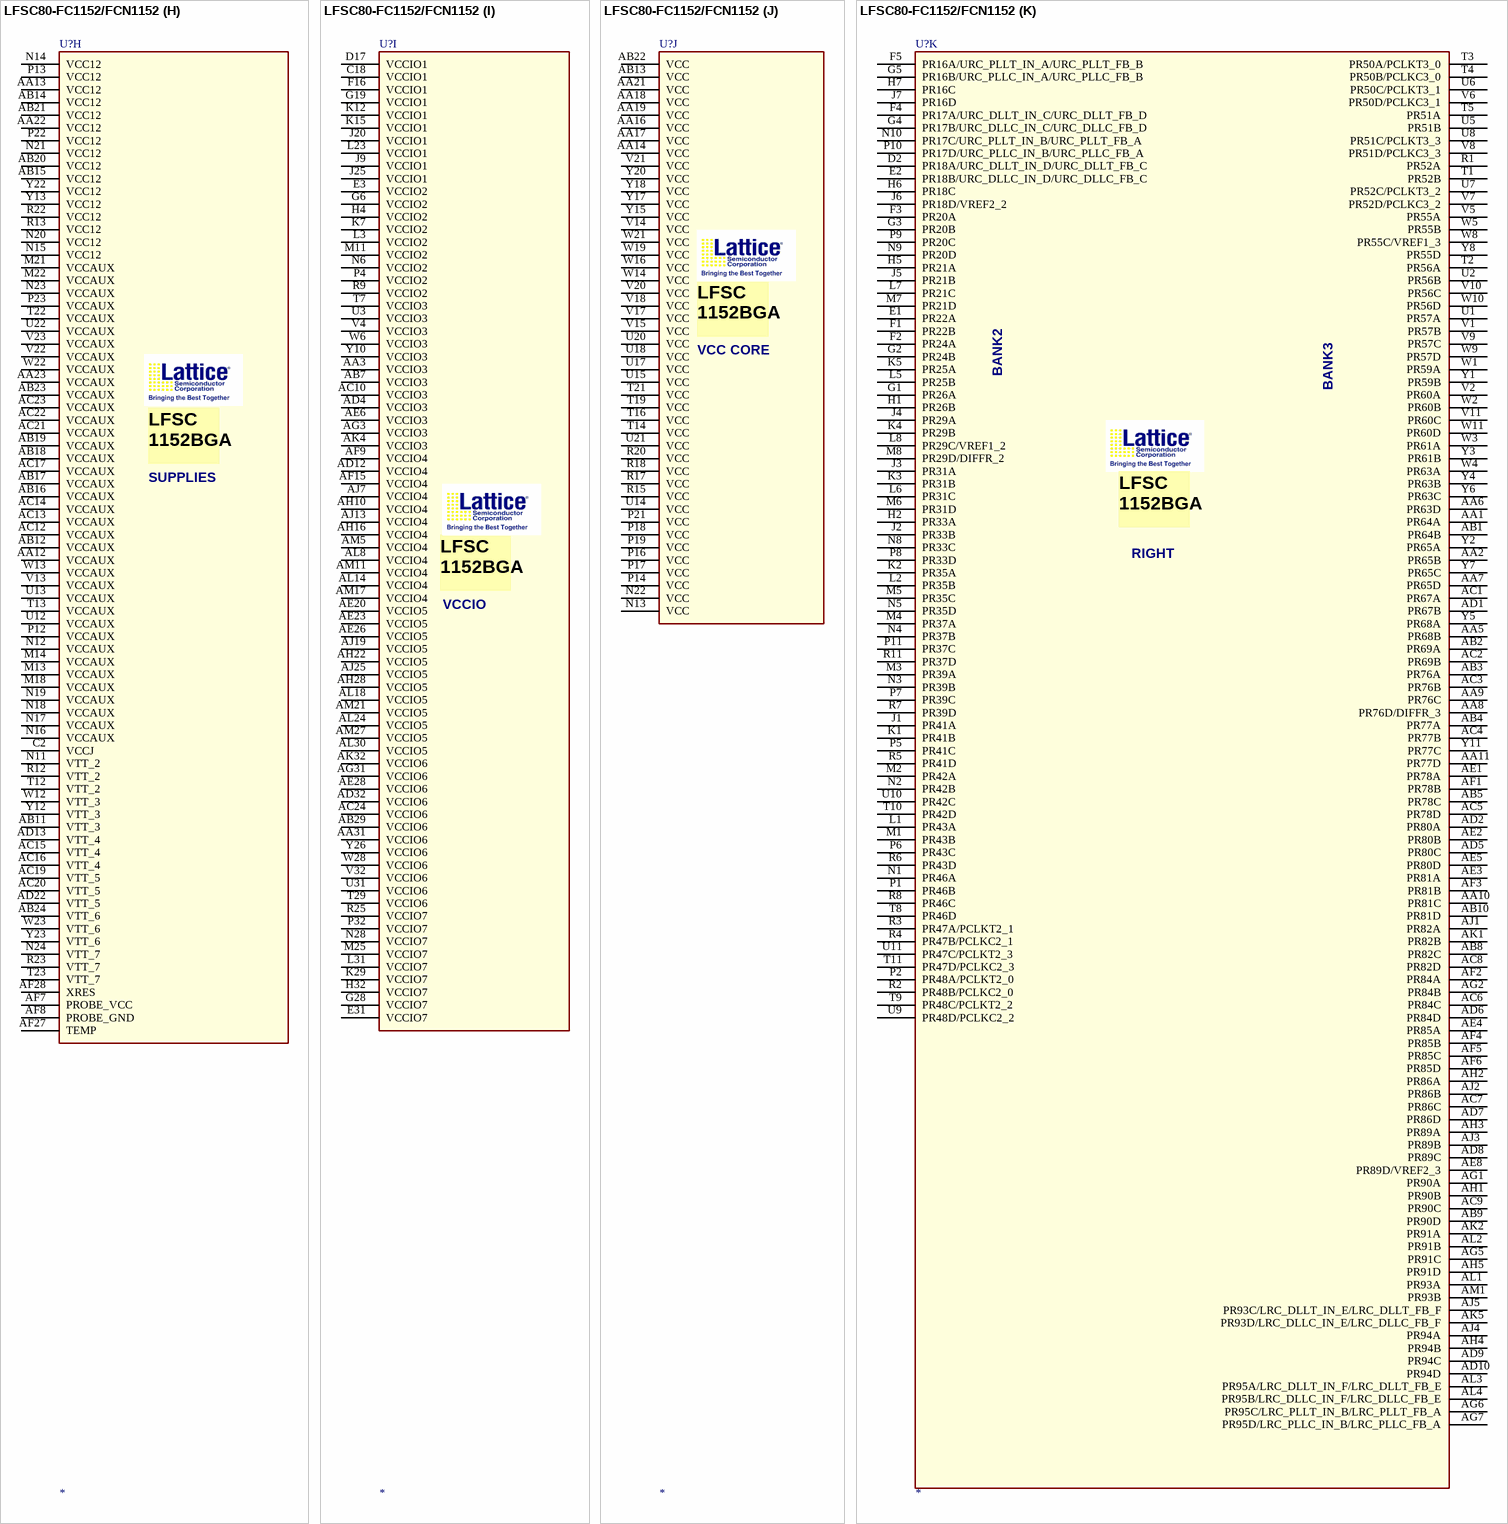
[diagram p239: symbol LFSC80-FC1152/FCN1152]